# Altium footprint library TranDangKhoa-LIB.PcbLib: 1435 footprints (part 71 of 90)
Each footprint in its own frame and in the unit in brackets; x right, y up, seen from the top. Pads: shape width x height; smd on the part's side, far side on the other; paste and mask are expansions set on the pad; w line width, h text height; cw(c..) or ccw(c..) is an arc to the next point about the centre after c.
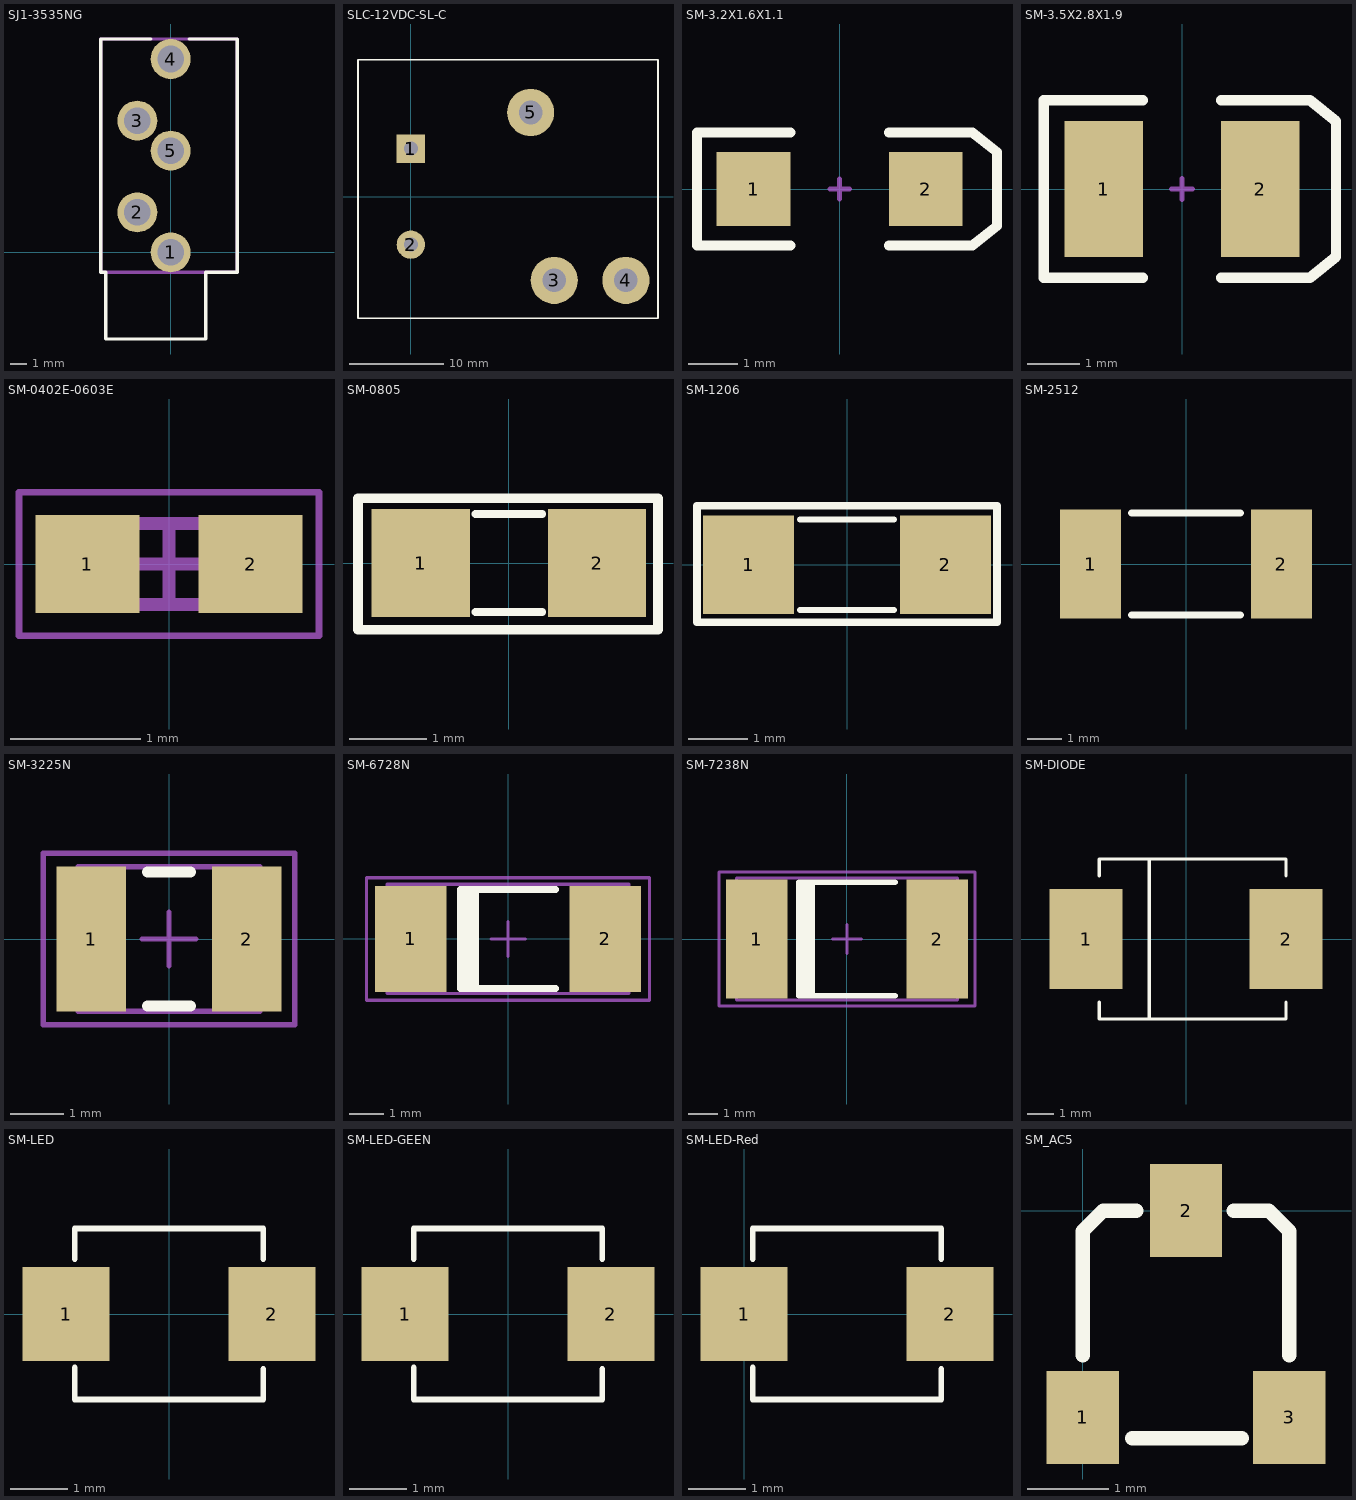
[diagram p70: the footprints below, top view; thin cyan lines are the x and y axes]

## SJ1-3535NG [mm]
pads (5):
  round 2.4 hole 1.6: 1(0,0) 2(-2,2.4) 3(-2,7.9) 4(0,11.6) 5(0,6.1)
Top Overlay:
  lines w0.2: -1.2,12.8 -4.2,12.8 -4.2,-1.2 -3.9,-1.2 -3.9,-5.2 2.1,-5.2 2.1,-1.2 4,-1.2 4,12.8 1.1,12.8
Top Solder:
  region: -1.65,8.65 0.65,6.35 -0.35,5.35 -2.65,7.65
Mechanical 1:
  lines w0.2: -4.2,12.8 -4.2,12.8
Mechanical 16:
  lines w0.2: -4.2,-1.2 -4.2,12.8 4,12.8 4,-1.2 -4.2,-1.2
Mechanical 29:
  text ".Designator" at -2,5.5 h1.2
3D body "SJ1-3535NG-PI.step": height 12.3, standoff -3.3, extent -4.2,-5.25 4,12.8

## SLC-12VDC-SL-C [mm] "RELAY"
height 28
pads (5):
  rect 3x3 hole 1.5: 1(0,5.08)
  round 3 hole 1.5: 2(0,-5.1)
  round 5 hole 2.5: 3(15.2,-8.89) 4(22.8,-8.89) 5(12.7,8.91)
Top Overlay:
  lines w0.2: 26.15,-12.9 -5.6,-12.9 ; 26.2,-12.9 26.2,14.5 -5.6,14.5 ; -5.6,-12.9 -5.6,14.5 ; -5.6,-12.9 -5.6,14.5

## SM-3.2X1.6X1.1 [mm] "SMT LED; 2 Flat Leads"
height 1.2
pads (2):
  rect 1.5x1.5 smd: 1(-1.75,0) 2(1.75,0)
Top Overlay:
  lines w0.2: -1,-1.15 -2.9,-1.15 -2.9,1.15 -1,1.15 ; 1,-1.15 2.7,-1.15 3.2,-0.75 3.2,0.75 2.7,1.15 1,1.15
Mechanical 1:
  lines w0.1: -0.2,0 0.2,0 ; 0,-0.2 0,0.2
3D body "SW3DPS-RESISTOR 1206-DEFAULT.STEP": height 0.53, standoff -0.03, extent -1.473,-0.889 1.727,0.771

## SM-3.5X2.8X1.9 [mm] "SM LED; 2 C-Bend Leads; Body 3.5 x 2.8 x 1.9 mm, inc leads (LxWxH typ)"
height 1.9
pads (2):
  rect 1.5x2.6 smd: 1(-1.5,0) 2(1.5,0)
Top Overlay:
  lines w0.2: -0.75,-1.7 -2.65,-1.7 -2.65,1.7 -0.75,1.7 ; 0.75,-1.7 2.45,-1.7 2.95,-1.3 2.95,1.3 2.45,1.7 0.75,1.7
Mechanical 1:
  lines w0.1: -0.2,0 0.2,0 ; 0,-0.2 0,0.2

## SM-0402E-0603E [mm] "Chip Resistor, 2-Leads, Body 1.10x0.62mm, IPC Medium Density"
height 0.5
pads (2):
  rect 0.8x0.75 smd: 1(-0.625,0) 2(0.625,0)
Mechanical 13:
  lines w0.1: -0.55,-0.31 0.55,-0.31 0.55,0.31 -0.55,0.31 -0.55,-0.31
Mechanical 15:
  lines w0.05: -1.15,-0.55 1.15,-0.55 1.15,0.55 -1.15,0.55 -1.15,-0.55
  lines w0.1: -0.31,0 0.31,0 ; 0,-0.31 0,0.31
3D body: height 0.5, standoff 0, extent 0.25,-0.31 0.55,0.31
3D body: height 0.5, standoff 0, extent -0.55,-0.31 -0.25,0.31
3D body: height 0.5, standoff 0, extent -0.25,-0.31 0.25,0.31

## SM-0805 [mil] "Compoment SMD 80x50mil"
height 50
pads (2):
  rect 50x55 smd: 1(-45,0) 2(45,0)
Top Overlay:
  lines w4: -17,-25 17,-25 ; -17,25 17,25
  lines w5: -77,-34 -77,33 76,33 76,-34 -77,-34
3D body "SW3dPS-smt_resistor_packages.STEP": height 24.02, standoff -0.39, extent -39.76,-27 39.77,23

## SM-1206 [mil] "Compoment SMD 120x60mil"
height 50
pads (2):
  rect 60x65 smd: 1(-65,0) 2(65,0)
Top Overlay:
  lines w4: -31,-30 31,-30 ; -31,30 31,30
  lines w5: -99,-38 -99,39 99,39 99,-38 -99,-38
3D body "User Library-res1206.STEP": height 24.79, standoff 0, extent -82.68,-35 82.68,35.87

## SM-2512 [mm] "Chip Resistor; Body 6.3 x 3.2 mm (LxW typ) - C"
height 0.6
pads (2):
  rect 1.8x3.2 smd: 1(-2.8,0) 2(2.8,0)
Top Overlay:
  lines w0.2: -1.6,-1.5 1.6,-1.5 ; -1.6,1.5 1.6,1.5

## SM-3225N [mm] "Chip Capacitor, Body 3.2x2.5mm, IPC Medium Density"
height 1.35
pads (2):
  rect 1.3x2.7 smd: 1(-1.45,0) 2(1.45,0)
Top Overlay:
  lines w0.2: -0.4,-1.25 0.4,-1.25 ; -0.4,1.25 0.4,1.25
Mechanical 13:
  lines w0.1: -1.7,-1.35 1.7,-1.35 1.7,1.35 -1.7,1.35 -1.7,-1.35
Mechanical 15:
  lines w0.1: -0.5,0 0.5,0 ; 0,-0.5 0,0.5 ; -2.35,-1.6 2.35,-1.6 2.35,1.6 -2.35,1.6 -2.35,-1.6
3D body: height 1.35, standoff 0, extent -1.7,-1.35 1.7,1.35

## SM-6728N [mm] "Chip Capacitor, Body 6.7x2.8mm, IPC Medium Density"
height 3.18
pads (2):
  rect 2.1x3.1 smd: 1(-2.85,0) 2(2.85,0)
Top Overlay:
  rectangle: -1.4,-1.45 -0.85,1.45
  lines w0.2: 1.4,-1.45 -1.4,-1.45 -1.4,1.45 1.4,1.45
Mechanical 13:
  lines w0.1: -3.55,-1.6 3.55,-1.6 3.55,1.6 -3.55,1.6 -3.55,-1.6
Mechanical 15:
  lines w0.1: -0.5,0 0.5,0 ; 0,-0.5 0,0.5 ; -4.15,-1.8 4.15,-1.8 4.15,1.8 -4.15,1.8 -4.15,-1.8
3D body: height 3.18, standoff 0, extent -3.55,-1.6 3.55,1.6

## SM-7238N [mm] "Chip Capacitor, Body 7.2x3.8mm, IPC Medium Density"
height 3.18
pads (2):
  rect 2.1x4.1 smd: 1(-3.1,0) 2(3.1,0)
Top Overlay:
  rectangle: -1.65,-1.95 -1.1,1.95
  lines w0.2: 1.65,-1.95 -1.65,-1.95 -1.65,1.95 1.65,1.95
Mechanical 13:
  lines w0.1: -3.8,-2.1 -3.8,2.1 3.8,2.1 3.8,-2.1 -3.8,-2.1
Mechanical 15:
  lines w0.1: -0.5,0 0.5,0 ; 0,-0.5 0,0.5 ; -4.4,-2.3 -4.4,2.3 4.4,2.3 4.4,-2.3 -4.4,-2.3
3D body: height 3.18, standoff 0, extent -3.8,-2.1 3.8,2.1

## SM-DIODE [mil] "Magnetic-Core Inductor with Winding Polarity Marking; 2 Leads"
pads (2):
  rect 110x150 smd: 1(-150,0) 2(150,0)
Top Overlay:
  lines w5: -130,-95 -130,-120 150,-120 150,-95 ; -130,95 -130,120 150,120 150,95 ; -55,-120 -55,120
Mechanical 1:
  lines w1: -130,-120 150,-120 ; -130,120 150,120
3D body "SW3DPS-DIOD SMD 10BF10-DEFAULT.STEP": height 96.27, standoff 0.6, extent -103.33,-72.86 105.33,68.87

## SM-LED [mil] "Compoment SMD 120x60mil"
height 50
pads (2):
  rect 60x65 smd: 1(-71,0) 2(71,0)
Top Overlay:
  lines w4: -65,-37 -65,-59 65,-59 65,-38 ; -65,38 -65,59 65,59 65,38

## SM-LED-GEEN [mil] "Compoment SMD 120x60mil"
height 50
pads (2):
  rect 60x65 smd: 1(-71,0) 2(71,0)
Top Overlay:
  lines w4: -65,-37 -65,-59 65,-59 65,-38 ; -65,38 -65,59 65,59 65,38
3D body "SW3dPS-LED1206G.STEP": height 43.81, standoff -15.9, extent -63,-32 63,31

## SM-LED-Red [mil]
pads (2):
  rect 60x65 smd: 1(0,0) 2(142,0)
Top Overlay:
  lines w4: 6,-37 6,-59 136,-59 136,-38 ; 6,38 6,59 136,59 136,38
3D body "SW3dPS-LED1206G.STEP": height 43.81, standoff -15.9, extent 10,-32 136,31

## SM_AC5 [mil]
pads (3):
  rect 35x45 smd: 1(0,-100) 2(50,0) 3(100,-100)
Top Overlay:
  lines w7: 0,-70 0,-10 10,0 26,0 ; 24,-110 77,-110 ; 73,0 90,0 100,-10 100,-70